# Altium schematic symbol library CUSTOM SCH - Copy.SchLib: 494 symbols (part 3 of 6) (continued)
## Micro HDMI Conn (continued)
HDMI - Micro Receptacle Connector 19 Position Surface Mount, Right Angle
footprint 46765-0001
footprint HDMI MICRO
pins: 1 HOT_PLUG_DETECT, 2 UTILITY, 3 TMDS_DATA2+, 4 TMDS_DATA2_SHIELD, 5 TMDS_DATA2-, 6 TMDS_DATA1+, 7 TMDS_DATA1_SHIELD, 8 TMDS_DATA1-, 9 TMDS_DATA0+, 10 TMDS_DATA0_SHIELD, 11 TMDS_DATA0-, 12 TMDS_CLOCK+, 13 TMDS_CLOCK_SHIELD, 14 TMDS_CLOCK-, 15 CEC, 16 DDC/CEC_GROUND, 17 SCL, 18 SDA, 19 +5V_POWER

## MICROPHONE
designator J?
MEMS Microphones High Dynamic Range Microphone with Differential Output and Low Power; Manufacturer Part Number: ICS-40619; Case/PackageManufacturer Part Number: LGA-6
footprint MIC-3.50 × 2.65 × 0.98 mm
pins: 1 GND, 2 GND, 3 OUTPUT-, 4 OUTPUT+, 5 GND, 6 VDD

## MK24-A-3
designator S?, comment Magnetic/Reed Switch
Molded Body Reed Switch SPST-NO 23 ~ 50AT Operate Range 1W 100mA _AC/DC_ 30V Surface Mount; Manufacturer Part Number: MK24-A-3; Package: SMD/SMT; Value: *
footprint MK24-A-3 (Reed Switch)
pins: 1, 2

## MMBT2222AM3T5G
designator Q?
ComponentLink1Description: Manufacturer Link; ComponentLink1URL: http://www.fairchildsemi.com/; ComponentLink2Description: Datasheet; ComponentLink2URL: http://www.fairchildsemi.com/ds/2N%2F2N3904.pdf
simulation model 2N3904 (NPN)
signal-integrity model 2N3904
pins: 1 B, 2 E, 3 C

## MMBT3904
designator Q?
SOT-23, 60V, 0.2A, NPN Bipolar Transistor; Package: SOT-23-3; Manufacturer Part Number: MMBT3904; Value: *
footprint SOT23_MMB3904
pins: 1 B, 2 E, 3 C

## MMBT3904_1
designator Q?
Bipolar _BJT_ Transistor NPN 40V 200mA 270MHz 350mW Surface Mount SOT-23-3; Manufacturer Part Number: MMBT3904; MF: STMicroelectronics; Price: None; Package: SOT-23-3 Taiwan Semiconductor; Value: *; Availability: Unavailable; SnapEDA_Link: https://www.snapeda.com/parts/MMBT3904/STMicroelectronics/view-part/2875870/?ref=snap
footprint SOT95P240X120-3N
pins: B 1, C 3, E 2

## MMBT3906
designator Q?
Bipolar (BJT) Transistor PNP 40V 200mA 250MHz 300mW Surface Mount SOT-23-3; Manufacturer Part Number: MMBT3906; Package: SOT-23-3
footprint SOT95P240X120-3N
footprint SOT95P240X120-3N
pins: 1 B, 2 E, 3 C

## MOSFET N_2SK3018
designator Q?  Manufacturer Part Number: 2SK3018  Case/Package: SOT-323
NMOS,2SK3018,SOT_323,Id=0.1A,Vds=30V
footprint SOT323
pins: 1 GATE, 2 SOURCE, 3 DRAIN

## MOSFET N_WNM6002-3/TR
designator Q?  Manufacturer Part Number: WNM6002-3/TR  Case/Package: SOT-323
NMOS,WNM6002-3/TR,SOT_323,Id=0.3A,Vds=60V
footprint SOT323
pins: 1 GATE, 2 SOURCE, 3 DRAIN

## MOSFET P_WPM3407
designator Q?  Manufacturer Part Number: WPM3407-3/TR  Case/Package: SOT-23
PMOS,WPM3407-3/TR,SOT_23,Id=4.4A,Vds=30V
footprint SOT23
footprint SOT_23
pins: 1 GATE, 2 SOURCE, 3 DRAIN

## MOSFET Si2302CDS
designator Q?, comment MOSFET-N Si2302CDS  (value not drawn)
N-Channel 20V 3A 1.25W (Ta) Surface Mount SOT-23; Manufacturer Part Number: SI2302-TP; ComponentLink1URL: http://www.vishay.com/docs/68645/si2302cd.pdf?src-supplier=Avnet; ComponentLink1Description: http://www.vishay.com/docs/68645/si2302cd.pdf?src-supplier=Avnet; ComponentLink2URL: http://www.farnell.com/datasheets/1719572.pdf?src-supplier=Element14; ComponentLink2Description: http://www.farnell.com/datasheets/1719572.pdf?src-supplier=Element14; ComponentLink3URL: http://www.vishay.com/docs/68645/si2302cd.pdf?src-supplier=Future+Electronics; ComponentLink3Description: http://www.vishay.com/docs/68645/si2302cd.pdf?src-supplier=Future+Electronics; ComponentLink4URL: http://www.vishay.com/docs/68645/si2302cds.pdf?src-supplier=Digi-Key; ComponentLink4Description: http://www.vishay.com/docs/68645/si2302cds.pdf?src-supplier=Digi-Key; Case/Package: SOT-23; ComponentLink5URL: http://www.mccsemi.com/up_pdf/SI2302(SOT-23).pdf?src-supplier=Digi-Key; ComponentLink5Description: http://www.mccsemi.com/up_pdf/SI2302(SOT-23).pdf?src-supplier=Digi-Key
simulation model NMOS (MOSFET-N)
footprint SOT95P240X115-3N
footprint SOT-23
pins: 1 G, 2 S, 3 D

## MOSFET_N_WNM2016
designator Q?  Manufacturer Part Number: WNM2016-3/TR  Case/Package: SOT-23
NMOS,WNM2016-3/TR,SOT_23,Id=3.2A,Vds=20V
footprint SOT23
footprint SOT_23
footprint SOT23-3
pins: 1 GATE, 2 SOURCE, 3 DRAIN

## MP1497
designator U?
footprint TSOT23-8
pins: 1 SS, 2 IN, 3 SW, 4 GND, 5 BST, 6 EN, 7 VCC, 8 FB

## MP2494DN
designator U?
Switching Voltage Regulators 2A; Manufacturer Part Number: MP2494DN-LF; Case/Package: SOIC8
footprint SOIC127P600X170-9N
footprint SOIC127P600X170-9N
pins: 1 VIN, 2 GND_1, 3 EN, 4 FB, 5 SS, 6 GS, 7 BST, 8 SW, 9 EPAD

## MP5416GR
designator U?
PMIC MP5416; Manufacturer Part Number: MP5416GR-0001-Z; Case/Package: QFN-28
footprint MP5416GR0001Z
pins: 1 VIN1, 2 SW1, 3 GND1, 4 GND3, 5 SW3, 6 VIN3, 7 FB3, 8 RSTO, 9 SCL, 10 SDA, 11 OUT4, 12 OUT5, 13 VIN5, 14 FB4, 15 VIN4, 16 SW4, 17 GND4, 18 GND2, 19 SW2, 20 VIN2, 21 FB2, 22 OUT3, 23 OUT2, 24 OUT_RTC, 25 AGND, 26 AVIN, 27 FB1, 28 NPBIN

## MP8007
designator U?
Power Over Ethernet Controller Channel 802.3af (PoE) 28-QFN (4x5); Manufacturer Part Number: MP8007; Case/Package: QFN-28 Monolithic Power Systems
footprint QFN28-4X5MM
pins: 1 AUX, 2 DET, 4 VDD, 5 FB2, 6 MODE, 7 FB1, 8 ILIM, 9 AGND, 10 VCC, 12 SW, 13 SW, 16 GND, 17 GND, 18 PG, 20 RTN, 21 RTN, 23 VSS, 24 VSS, 25 FTY, 26 CLASS, 27 T2P, 29 GND

## MP8759GD-Z
designator U?  Manufacturer Part Number: MP8759GD-Z
Case/Package: QFN-12
footprint QFN-12_2x3mm
pins: 1 VIN, 2 PGND, 3 PG, 4 NC, 5 VOUT, 6 MODE, 7 SW, 8 BST, 9 VCC, 10 AGND, 11 FB, 12 EN

## MPU-6050
designator U?
Accelerometer, Gyroscope, 6 Axis Sensor IÂ²C Output; MF: TDK InvenSense; Package: VFQFN-24 TDK InvenSense; Manufacturer Part Number: MPU-6050; Value: *
footprint QFN50P400X400X95-24N
footprint QFN50P400X400X95-24N
pins: 1 CLKIN (in), 6 AUX_DA (io), 7 AUX_CL (in), 8 VLOGIC (power), 9 AD0 (in), 10 REGOUT, 11 FSYNC (in), 12 INT (out), 13 VDD (power), 18 GND (power), 19 RESV@1, 20 CPOUT, 21 RESV@2, 22 RESV, 23 SCL (in), 24 SDA (io)

## MX25L512EOI-10G
designator U?
Manufacturer Part Number: MX25L512EOI-10G; Case/Package: TSSOP-8
footprint TSSOP-8
pins: 1 CS#, 2 SO/SIO1, 3 WP#, 4 GND, 5 SI/SIO0, 6 SCLK, 7 HOLD#, 8 VCC

## MX25L12835F
designator U?
Macronix MX25L12835FM2I-10G 128Mbit Flash Memory; 3V; Manufacturer Part Number: MX25L12835FM2I-10G; Case/Package: SOP-8
footprint SOIC127P790X216-8N
pins: 1 CS#, 2 SO/SIO1, 3 WP#/SIO2, 4 GND, 5 SI/SIO0, 6 SCLK, 7 RESET#/SIO3, 8 VCC

## NAND GATE 2 INPUT
designator U?
Manufacturer: ON Semiconductor / Fairchild; Manufacturer Part Number: NC7S00M5X; Max Supply Voltage: 6V; Min Supply Voltage: 2V; High Level Output Current: -2.6mA; Low Level Output Current: 2.6mA; Propagation Delay: 12.2ns; Number of Gates: 1; Logic Function: NAND; Quiescent Current: 1uA; Number of Inputs: 2; Turn-On Delay Time: 100ns; Supplier 1: Mouser; Stock 1: 16117; Pricing 1: 1=0.49, 10=0.318, 50=0.318, 100=0.136, 1000=0.104, 3000=0.079, 9000=0.07, 10000=0.07, 24000=0.066, 45000=0.064 (USD); Mount: Surface Mount; Case/Package: SOT-23-5; Number of Pins: 5; Weight: 0.03g; Min Operating Temperature: -40°C; Max Operating Temperature: 85°C; Packaging: Tape and Reel; Number of Elements: 1; Number of Outputs: 1; Package Quantity: 1; Number of Circuits: 1; Output Current: 2.6mA; Radiation Hardening: No; REACH SVHC: No SVHC; Lead Free: Lead Free; ComponentLink1URL: https://www.onsemi.com/pub/Collateral/NC7S00-D.PDF?src-supplier=Digi-Key; ComponentLink1Description: https://www.onsemi.com/pub/Collateral/NC7S00-D.PDF?src-supplier=Digi-Key; ComponentLink2URL: https://www.fairchildsemi.com/datasheets/NC/NC7S00.pdf?src-supplier=Avnet; ComponentLink2Description: https://www.fairchildsemi.com/datasheets/NC/NC7S00.pdf?src-supplier=Avnet; ComponentLink3URL: http://www.fairchildsemi.com/ds/NC/NC7S00.pdf?src-supplier=Future+Electronics; ComponentLink3Description: http://www.fairchildsemi.com/ds/NC/NC7S00.pdf?src-supplier=Future+Electronics; ComponentLink4URL: http://www.farnell.com/datasheets/88771.pdf?src-supplier=Element14; ComponentLink4Description: http://www.farnell.com/datasheets/88771.pdf?src-supplier=Element14; ComponentLink5URL: http://www.fairchildsemi.com/ds/NC/NC7S00.pdf?src-supplier=Avnet+Europe; ComponentLink5Description: http://www.fairchildsemi.com/ds/NC/NC7S00.pdf?src-supplier=Avnet+Europe; ComponentLink6URL: https://www.verical.com/server-webapp/html/getDatasheet?partID=72609&src-supplier=Verical; ComponentLink6Description: https://www.verical.com/server-webapp/html/getDatasheet?partID=72609&src-supplier=Verical; ComponentLink7URL: http://www.fairchildsemi.com/datasheets/NC/NC7S00.pdf?src-supplier=Digi-Key; ComponentLink7Description: http://www.fairchildsemi.com/datasheets/NC/NC7S00.pdf?src-supplier=Digi-Key; Supplier Part Number 1: 512-NC7S00M5X
footprint SOT23-5
pins: 1 A, 2 B, 3 GND, 4 Y, 5 VCC

## Nano sim card
designator J?
Manufacturer: Wurth Electronics; Manufacturer Part Number: 693043020611; Number of Positions: 6; Connector Type: Connector; Supplier 1: Mouser; Stock 1: 7555; Pricing 1: 1=1.69, 10=1.66, 25=1.66, 50=1.54, 100=1.41, 250=1.41, 500=1.23, 1000=1.11 (USD); Mount: Surface Mount; Number of Pins: 6; Contact Material: Copper Alloy; Contact Plating: Gold; Packaging: Tape and Reel; Number of Contacts: 6; Features: Shielded; REACH SVHC: Unknown; Lead Free: Lead Free; ComponentLink1URL: https://www.distrelec.biz/Web/Downloads/40/13/693043020611.pdf?mime=application%2Fpdf&src-supplier=Distrelec; ComponentLink1Description: https://www.distrelec.biz/Web/Downloads/40/13/693043020611.pdf?mime=application%2Fpdf&src-supplier=Distrelec; ComponentLink2URL: https://katalog.we-online.de/em/datasheet/693043020611.pdf?src-supplier=Digi-Key; ComponentLink2Description: https://katalog.we-online.de/em/datasheet/693043020611.pdf?src-supplier=Digi-Key; ComponentLink3URL: http://www.farnell.com/cad/1889811.pdf?src-supplier=Element14; ComponentLink3Description: http://www.farnell.com/cad/1889811.pdf?src-supplier=Element14; Supplier Part Number 1: 710-693043020611
footprint Nano sim card connector
pins: 7 S1, 8 S2, 9 S3, 10 S4, 11 S5, 12 S6, C1 VDD, C2 RST, C3 CLK, C5 GND, C6 VPP, C7 I/O

## Nano sim card_1
designator J?
Standard Size Sim Holder MUP-C720 (Push-Push Lock Type); Manufacturer: MUP Industrial Co.; Manufacturer Part Number: MUP-C720; ComponentLink1URL: https://www.distrelec.biz/Web/Downloads/40/13/693043020611.pdf?mime=application%2Fpdf&src-supplier=Distrelec; ComponentLink1Description: https://www.distrelec.biz/Web/Downloads/40/13/693043020611.pdf?mime=application%2Fpdf&src-supplier=Distrelec; ComponentLink2URL: https://katalog.we-online.de/em/datasheet/693043020611.pdf?src-supplier=Digi-Key; ComponentLink2Description: https://katalog.we-online.de/em/datasheet/693043020611.pdf?src-supplier=Digi-Key; ComponentLink3URL: http://www.farnell.com/cad/1889811.pdf?src-supplier=Element14; ComponentLink3Description: http://www.farnell.com/cad/1889811.pdf?src-supplier=Element14
footprint MUP-C720
pins: 7 CD2, 8 CD1, 9 S3, 10 S4, C1 VDD, C2 RST, C3 CLK, C5 GND, C6 VPP, C7 I/O

## NCV8114ASN180T1G
designator U?
LDO Regulator 1.8V; Manufacturer_Name: ON Semiconductor; Manufacturer Part Number: NCV8114ASN180T1G; Datasheet Link: http://www.onsemi.com/pub/Collateral/NCV8114-D.PDF; Height: 1.1mm; Mouser Part Number: 863-NCV8114ASN180T1G
footprint SOT95P275X110-5N
footprint SOT95P275X110-5N
pins: 1 IN, 2 GND, 3 EN, 4 N/C, 5 OUT

## Net Tie
designator NT?, comment NetTie  (net tie, no BOM)
footprint Net_Tie
pins: 1, 2
text: NT

## Net Tie_1
designator NT?, comment NetTie  (net tie, no BOM)
footprint coil_50mm
pins: 1, 2

## NPN_BC547
designator Q2
Manufacturer: ON Semiconductor / Fairchild; Mfr No.: MMBT3904; Value: NPN; Collector Emitter Breakdown Voltage: 40V; Power Dissipation: 350mW; Max Collector Current: 200mA; Collector Base Voltage (VCBO): 60V; Emitter Base Voltage (VEBO): 6V; Frequency: 300MHz; hFE Min: 100; Number of Elements: 1; Element Configuration: Single; Collector Emitter Saturation Voltage: 300mV; Supplier 1: RSComponents; Supplier Part Number 1: 739-0303; Stock 1: 0; Mount: Surface Mount; Package: SOT-23; Number of Pins: 3; Weight: 0.03g; Contact Plating: Matte,Tin; Min Operating Temperature: -55°C; Max Operating Temperature: 150°C; Packaging: Tape and Reel; Collector Emitter Voltage (VCEO): 40V; Voltage Rating (DC): 40V; Package Quantity: 1; Max Power Dissipation: 350mW; Transition Frequency: 300MHz; Max Breakdown Voltage: 40V; Gain Bandwidth Product: 300MHz; Current Rating: 200mA; Max Frequency: 300MHz; Termination: SMD/SMT; Length: 0.25inch; Height: 0.25inch; Width: 0.25inch; Radiation Hardening: No; REACH SVHC: No SVHC; Lead Free: Lead Free; ComponentLink1URL: https://www.onsemi.com/pub/Collateral/PZT3904-D.pdf?src-supplier=Digi-Key; ComponentLink1Description: https://www.onsemi.com/pub/Collateral/PZT3904-D.pdf?src-supplier=Digi-Key; ComponentLink2URL: https://www.fairchildsemi.com/package-drawings/MA/MA03B.pdf?src-supplier=Digi-Key; ComponentLink2Description: https://www.fairchildsemi.com/package-drawings/MA/MA03B.pdf?src-supplier=Digi-Key; ComponentLink3URL: http://www.farnell.com/datasheets/2150085.pdf?src-supplier=Element14; ComponentLink3Description: http://www.farnell.com/datasheets/2150085.pdf?src-supplier=Element14; ComponentLink4URL: http://www.fairchildsemi.com/ds/MM/MMBT3904.pdf?src-supplier=Avnet+Europe; ComponentLink4Description: http://www.fairchildsemi.com/ds/MM/MMBT3904.pdf?src-supplier=Avnet+Europe; ComponentLink5URL: https://www.verical.com/server-webapp/html/getDatasheet?partID=110107&src-supplier=Verical; ComponentLink5Description: https://www.verical.com/server-webapp/html/getDatasheet?partID=110107&src-supplier=Verical; ComponentLink6URL: http://www.fairchildsemi.com/ds/2N/2N3904.pdf?src-supplier=Element14; ComponentLink6Description: http://www.fairchildsemi.com/ds/2N/2N3904.pdf?src-supplier=Element14; ComponentLink7URL: https://www.fairchildsemi.com/datasheets/MM/MMBT3904.pdf?src-supplier=Avnet; ComponentLink7Description: https://www.fairchildsemi.com/datasheets/MM/MMBT3904.pdf?src-supplier=Avnet; ComponentLink8URL: http://www.fairchildsemi.com/ds/MM/MMBT3904.pdf?src-supplier=Future+Electronics; ComponentLink8Description: http://www.fairchildsemi.com/ds/MM/MMBT3904.pdf?src-supplier=Future+Electronics
footprint SOT23 (PNP Transistor Pack)
pins: B, C, E

## NPN_S8050
designator Q?  Manufacturer Part Number: S8050  Case/Package: SOT-23
NPN S8050 SOT23
footprint SOT23 (SOT-23; 3 Leads; Body 3.0 x 2.6 mm Pitch 0.95mm)
pins: 1 BASE, 2 EMITTER, 3 COLLECTOR

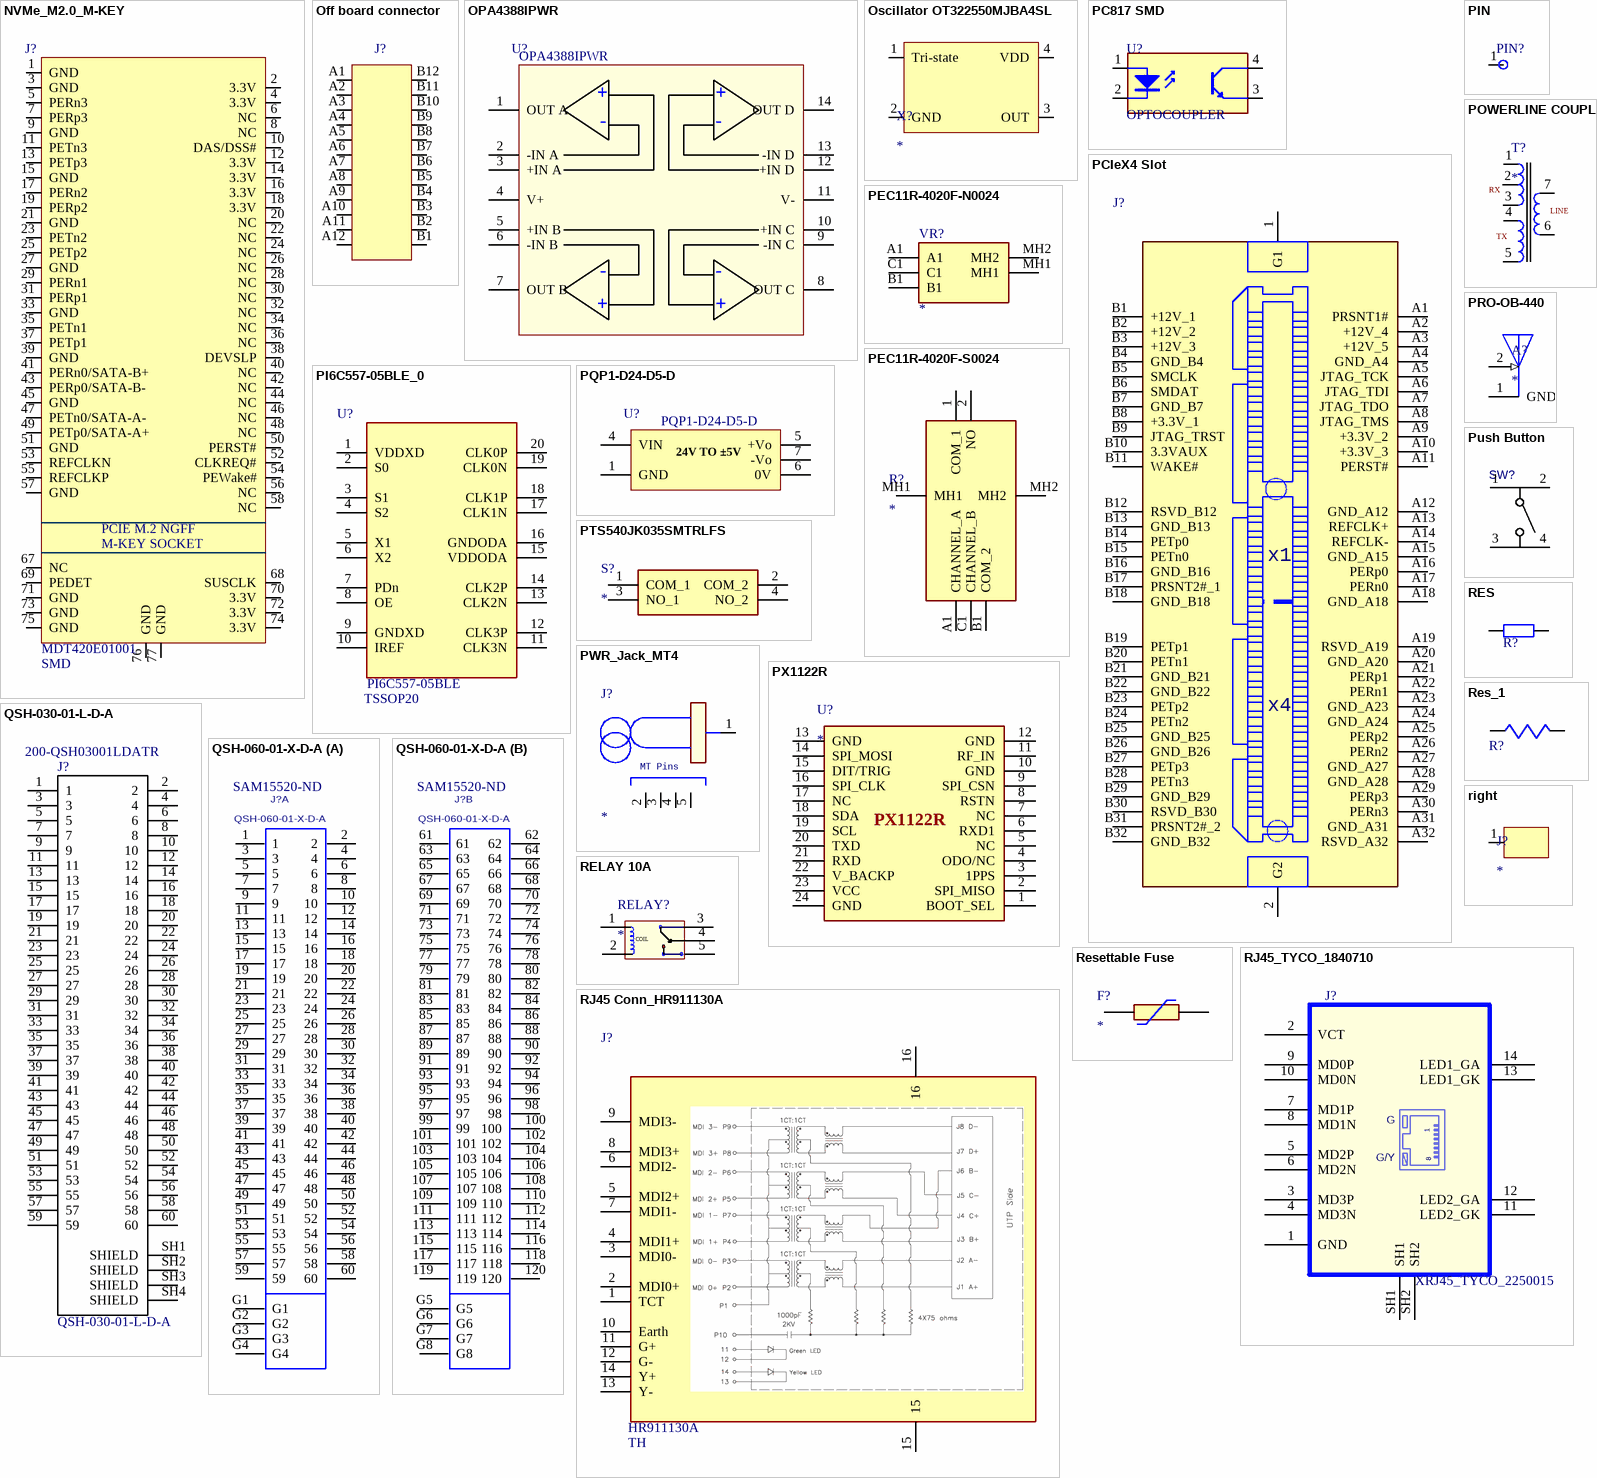
[diagram p20: symbols NVMe_M2.0_M-KEY to RJ45_TYCO_1840710]

## NVMe_M2.0_M-KEY
designator J?  Case/Package: SMD  Manufacturer Part Number: MDT420E01001
M.2 0.5mm Surface Mount 67 SMD Card Edge Connectors ROHS
footprint NVME_M 2.0
pins: 1 GND, 2 3.3V, 3 GND, 4 3.3V, 5 PERn3, 6 NC, 7 PERp3, 8 NC, 9 GND, 10 DAS/DSS#, 11 PETn3, 12 3.3V, 13 PETp3, 14 3.3V, 15 GND, 16 3.3V, 17 PERn2, 18 3.3V, 19 PERp2, 20 NC, 21 GND, 22 NC, 23 PETn2, 24 NC, 25 PETp2, 26 NC, 27 GND, 28 NC, 29 PERn1, 30 NC, 31 PERp1, 32 NC, 33 GND, 34 NC, 35 PETn1, 36 NC, 37 PETp1, 38 DEVSLP, 39 GND, 40 NC, 41 PERn0/SATA-B+, 42 NC, 43 PERp0/SATA-B-, 44 NC, 45 GND, 46 NC, 47 PETn0/SATA-A-, 48 NC, 49 PETp0/SATA-A+, 50 PERST#, 51 GND, 52 CLKREQ#, 53 REFCLKN, 54 PEWake#, 55 REFCLKP, 56 NC, 57 GND, 58 NC, 67 NC, 68 SUSCLK, 69 PEDET, 70 3.3V, 71 GND, 72 3.3V, 73 GND, 74 3.3V, 75 GND, 76 GND, 77 GND
text: PCIE M.2 NGFF; M-KEY SOCKET

## Off board connector
designator J?
USB 3.1 Waterproof C Female Connector
pins: A1, A2, A3, A4, A5, A6, A7, A8, A9, A10, A11, A12, B1, B2, B3, B4, B5, B6, B7, B8, B9, B10, B11, B12

## OPA4388IPWR
designator U?  Manufacturer Part Number: OPA4388IPWR
Op Amp Quad Zero Drift Amplifier R-R I/O ±2.75V/5.5V 14-Pin TSSOP; Manufacturer: Texas Instruments; Supplier 1: Digi-Key; RoHS: No; Case/Package: TSSOP-14; Stock 1: 1444; Pricing 1: 1=4.64000, 10=4.16700, 25=3.93960, 100=3.23940, 250=2.90668, 500=2.80160, 1000=2.32883 (USD); Supplier Part Number 1: 296-OPA4388IPWRCT-ND
footprint TSSOP-14
pins: 1 OUT A, 2 -IN A, 3 +IN A , 4 V+, 5 +IN B , 6 -IN B, 7 OUT B, 8  OUT C, 9 -IN C, 10 +IN C, 11 V-, 12 +IN D, 13 -IN D, 14 OUT D
text: +; -

## Oscillator OT322550MJBA4SL
designator X?
1.8V~3.3V -40℃~+85℃ ±10ppm 50MHz SMD3225-4P Oscillators ROHS (OT322550MJBA4SL) (C717684); Vicharak-PN: V000176; Manufacturer Part Number: OT322550MJBA4SL; Case/Package: SMD3225; Frequency: 50mhz
footprint Crystal_3225 (3225 pack)
pins: 1 Tri-state, 2 GND, 3 OUT, 4 VDD

## PC817 SMD
designator U?, comment OPTOCOUPLER
Transistor Output Optocouplers Hi-Iso Photo 1-Ch; Manufacturer Part Number: PC817 SMD; Case/Package: SMD
footprint DIP-4 (DIP; 4 Leads; Row Spacing 7.62 mm; Pitch 2.54 mm)
footprint pc817_smd
pins: 1 A "Anode", 2 K "Cathode", 3 E "Emitter", 4 C "Collector"

## PCIeX4 Slot
designator J?
PCIe-SMT-64PIN; Manufacturer Part Number: *; Case/Package: *
footprint PCIE64_X4_SMT
pins: 1 G1, 2 G2, A1 PRSNT1#, A2 +12V_4, A3 +12V_5, A4 GND_A4, A5 JTAG_TCK, A6 JTAG_TDI, A7 JTAG_TDO, A8 JTAG_TMS, A9 +3.3V_2, A10 +3.3V_3, A11 PERST#, A12 GND_A12, A13 REFCLK+, A14 REFCLK-, A15 GND_A15, A16 PERp0, A17 PERn0, A18 GND_A18, A19 RSVD_A19, A20 GND_A20, A21 PERp1, A22 PERn1, A23 GND_A23, A24 GND_A24, A25 PERp2, A26 PERn2, A27 GND_A27, A28 GND_A28, A29 PERp3, A30 PERn3, A31 GND_A31, A32 RSVD_A32, B1 +12V_1, B2 +12V_2, B3 +12V_3, B4 GND_B4, B5 SMCLK, B6 SMDAT, B7 GND_B7, B8 +3.3V_1, B9 JTAG_TRST, B10 3.3VAUX, B11 WAKE#, B12 RSVD_B12, B13 GND_B13, B14 PETp0, B15 PETn0, B16 GND_B16, B17 PRSNT2#_1, B18 GND_B18, B19 PETp1, B20 PETn1, B21 GND_B21, B22 GND_B22, B23 PETp2, B24 PETn2, B25 GND_B25, B26 GND_B26, B27 PETp3, B28 PETn3, B29 GND_B29, B30 RSVD_B30, B31 PRSNT2#_2, B32 GND_B32
text: x1; x4

## PEC11R-4020F-N0024
designator VR?
Rotary Encoder RS Components PEC11R-4020F-N0024; Datasheet Link: https://www.bourns.com/docs/Product-Datasheets/PEC11R.pdf; Manufacturer Part Number: PEC11R-4020F-N0024; Mouser Part Number: 652-PEC11R-4020F-N24
footprint PEC11R4215FN0012
pins: A1, B1, C1, MH1, MH2

## PEC11R-4020F-S0024
designator R?
Rotary Encoder with switch; Manufacturer Part Number: PEC11R-4020F-S0024; Datasheet Link: https://www.bourns.com/docs/Product-Datasheets/PEC11R.pdf; Height: 27.5mm; Mouser Part Number: 652-PEC11R-4020F-S24
footprint PEC11R4220FS0024
pins: 1 COM_1, 2 NO, A1 CHANNEL_A, B1 COM_2, C1 CHANNEL_B, MH1, MH2

## PI6C557-05BLE_0
designator U?  Case/Package: TSSOP20
PI6C557-05BLE; Manufacturer Part Number: PI6C557-05BLE
footprint TSSOP20
footprint TSSOP20_6R50x4R40x1R20
footprint TSSOP20 (TSSOP20_6R50X4R40X1R20)
pins: 1 VDDXD, 2 S0, 3 S1, 4 S2, 5 X1, 6 X2, 7 PDn, 8 OE, 9 GNDXD, 10 IREF, 11 CLK3N, 12 CLK3P, 13 CLK2N, 14 CLK2P, 15 VDDODA, 16 GNDODA, 17 CLK1N, 18 CLK1P, 19 CLK0N, 20 CLK0P

## PIN
designator PIN?  (value not drawn)  (no BOM)
footprint pin
pins: 1 VOUT

## POWERLINE COUPLER
designator T?
pins: 1, 2, 3, 4, 5, 6, 7
text: RX; LINE; TX

## PQP1-D24-D5-D
designator U?  Manufacturer Part Number: PQP1-D24-D5-D
Manufacturer: CUI; Supplier 1: Digi-Key; RoHS: No; Stock 1: 67; Case/Package: TH; Supplier Part Number 1: 102-PQP1-D24-D5-D-ND
pins: 1 GND, 4 VIN, 5 +Vo, 6 0V, 7 -Vo
text: 24V TO ±5V

## PRO-OB-440
designator A?
RF ANT 2.4GHZ STAMPED MET SLD; Manufacturer: Proant; Manufacturer Part Number: PRO-OB-440; Number of Bands: 1; Return Loss: -10dB; Supplier 1: Digi-Key; RoHS: No; Category: RF Antennas; Stock 1: 48124; Pricing 1: 1=0.74000, 10=0.64700, 25=0.60800, 100=0.49640, 250=0.46104, 500=0.39238 (USD); Mount: Surface Mount; Packaging: Cut Tape; Termination: Solder; ComponentLink1URL: https://media.digikey.com/pdf/Data%20Sheets/Proant%20PDF's/PRO-OB-440_Dwg.PDF?src-supplier=Digi-Key; ComponentLink1Description: https://media.digikey.com/pdf/Data%20Sheets/Proant%20PDF's/PRO-OB-440_Dwg.PDF?src-supplier=Digi-Key; ComponentLink2URL: http://www.proant.se/files/user/Application%20note%20-%20OnBoard%20SMD%20GNSS%20rev%202.0.pdf?src-supplier=Digi-Key; ComponentLink2Description: http://www.proant.se/files/user/Application%20note%20-%20OnBoard%20SMD%20GNSS%20rev%202.0.pdf?src-supplier=Digi-Key; ComponentLink3URL: http://www.proant.se/files/user/Documents/Datasheet%20-%20OnBoard%20SMD%202400%20MHz%20rev%203.pdf?src-supplier=Digi-Key; ComponentLink3Description: http://www.proant.se/files/user/Documents/Datasheet%20-%20OnBoard%20SMD%202400%20MHz%20rev%203.pdf?src-supplier=Digi-Key; Supplier Part Number 1: 1532-1001-1-ND
footprint ANT_PRO-OB-440
pins: 1 GND (power), 2 FEED (in)

## PTS540JK035SMTRLFS
designator S?
PTS540JK035SMTRLFS (Tactile Switches) Momentery Switch; Manufacturer Part Number: PTS540JK035SMTRLFS; Case/Package: SMD
footprint PTS540JK035SMTRLFS
pins: 1 COM_1, 2 COM_2, 3 NO_1, 4 NO_2

## Push Button
designator SW?
Push Button SPST 50mA 3X1.7 MM 100mΩ Tactile Switch; Manufacturer Part Number: TS-1809SM-C; Case/Package: SMD
footprint Push button (TS-1089S-02526)
pins: 1, 2, 3, 4

## PWR_Jack_MT4
designator J?
pins: 1 (io), 2 (io), 3 (io), 4, 5
text: MT Pins

## PX1122R
designator U?
SkyTra PX1122R Multi band GNSS Receiver with RTK; Manufacturer Part Number: PX1122R; Case/Package: SMD
footprint PX1122R
pins: 1 BOOT_SEL, 2 SPI_MISO, 3 1PPS, 4 ODO/NC, 5 NC, 6 RXD1, 7 NC, 8 RSTN, 9 SPI_CSN, 10 GND, 11 RF_IN, 12 GND, 13 GND, 14 SPI_MOSI, 15 DIT/TRIG, 16 SPI_CLK, 17 NC, 18 SDA, 19 SCL, 20 TXD, 21 RXD, 22 V_BACKP, 23 VCC, 24 GND

## QSH-030-01-L-D-A
designator J?  Supplier Part Number 1: 200-QSH03001LDATR
Conn Micro High Speed Socket Strip SKT 60 POS 0.5mm Solder ST SMD T/R; Manufacturer: Samtec; Manufacturer Part Number: QSH-030-01-L-D-A-TR; Max Voltage Rating (AC): 125V; Number of Contacts: 60; Gender: Female; Supplier 1: Mouser; Stock 1: 471; Pricing 1: 1=9.52, 10=8.81, 50=7.9, 100=7.38, 1000=6.19, 10000=5.95 (USD); Contact Plating: Gold; Contact Material: Bronze; Housing Color: Black; Housing Material: Polymer; Min Operating Temperature: -55°C; Max Operating Temperature: 125°C; Number of Rows: 2; Packaging: Tape and Reel; Termination: Solder; Orientation: Straight; Voltage Rating (AC): 125V; Length: 21.27mm; Pitch: 0.5mm; Depth: 7.49mm; Radiation Hardening: No; Lead Free: Lead Free; ComponentLink1URL: http://www.samtec.com/ftppub/pdf/QSH.PDF?src-supplier=Avnet+Europe; ComponentLink1Description: http://www.samtec.com/ftppub/pdf/QSH.PDF?src-supplier=Avnet+Europe; ComponentLink2URL: https://www.samtec.com/ftppub/pdf/QSH.PDF?src-supplier=Avnet; ComponentLink2Description: https://www.samtec.com/ftppub/pdf/QSH.PDF?src-supplier=Avnet
footprint QSH-030-01-L-D-A
pins: 1, 2, 3, 4, 5, 6, 7, 8, 9, 10, 11, 12, 13, 14, 15, 16, 17, 18, 19, 20, 21, 22, 23, 24, 25, 26, 27, 28, 29, 30, 31, 32, 33, 34, 35, 36, 37, 38, 39, 40, 41, 42, 43, 44, 45, 46, 47, 48, 49, 50, 51, 52, 53, 54, 55, 56, 57, 58, 59, 60, SH1 SHIELD, SH2 SHIELD, SH3 SHIELD, SH4 SHIELD

## QSH-060-01-X-D-A
designator J?  Supplier Part Number 1: SAM15520-ND
HIGH SPEED SOCKET STRIP, .5mm PITCH, 60 PINS PER ROW; MANUFACTURER: SAMTEC; Manufacturer Part Number: QSH-060-01-H-D-A; Number of Contacts: 120; Max Voltage Rating (AC): 125V; Gender: Female; Pitch: 0.5mm; CREATED: March 10, 2015 - Wendy Xin; PCB DECAL: QSH-060-01-X-D-A; Supplier 1: Digi-Key; Stock 1: 12; Pricing 1: 1=13.19, 10=12.746, 25=12.306, 50=11.8666, 100=11.427, 250=11.2072, 500=10.9875 (USD); Contact Plating: Gold; Contact Material: Bronze; Housing Color: Black; Housing Material: Polymer; Min Operating Temperature: -55°C; Max Operating Temperature: 125°C; Number of Rows: 2; Packaging: Tray; Termination: Solder; Orientation: Straight; Length: 41.27mm; Depth: 7.49mm; Radiation Hardening: No; ComponentLink1URL: http://datasheet.octopart.com/QSH-060-01-H-D-A-Samtec-datasheet-97183482.pdf?src-supplier=Samtec; ComponentLink1Description: http://datasheet.octopart.com/QSH-060-01-H-D-A-Samtec-datasheet-97183482.pdf?src-supplier=Samtec; ComponentLink2URL: http://sigma.octopart.com/97183504/technical_drawing/Samtec-QSH-060-01-H-D-A.pdf?src-supplier=Samtec; ComponentLink2Description: http://sigma.octopart.com/97183504/technical_drawing/Samtec-QSH-060-01-H-D-A.pdf?src-supplier=Samtec
footprint QSH-060-01-X-D-A
part A pins: 1, 2, 3, 4, 5, 6, 7, 8, 9, 10, 11, 12, 13, 14, 15, 16, 17, 18, 19, 20, 21, 22, 23, 24, 25, 26, 27, 28, 29, 30, 31, 32, 33, 34, 35, 36, 37, 38, 39, 40, 41, 42, 43, 44, 45, 46, 47, 48, 49, 50, 51, 52, 53, 54, 55, 56, 57, 58, 59, 60, G1, G2, G3, G4
part B pins: 61, 62, 63, 64, 65, 66, 67, 68, 69, 70, 71, 72, 73, 74, 75, 76, 77, 78, 79, 80, 81, 82, 83, 84, 85, 86, 87, 88, 89, 90, 91, 92, 93, 94, 95, 96, 97, 98, 99, 100, 101, 102, 103, 104, 105, 106, 107, 108, 109, 110, 111, 112, 113, 114, 115, 116, 117, 118, 119, 120, G5, G6, G7, G8

## RELAY 10A
designator RELAY?
footprint RELAY 10A
pins: 1, 2, 3, 4, 5
text: COIL

## RES
designator R?
Thick Film Resistor -  ohm, 1%, 0402; Manufacturer Part Number: *; Value: *; Case/Package: *; Tolerance: *
pins: 1, 2

## Res_1
designator R?
-
pins: 1, 2

## Resettable Fuse
designator F?
Resettable Fuses - PPTC 12V     6A-HD    50A MAX 2920; Manufacturer Part Number: 2920L600/12MR; Value: 6A Hold; Case/Package: 2920
footprint Fuse 2920
pins: 1, 2

## right
designator J?
footprint right
footprint right
pins: 1

## RJ45 Conn_HR911130A
designator J?  Case/Package: TH  Manufacturer Part Number: HR911130A
RJ45 Connector
footprint HR911130A
pins: 1 TCT, 2 MDI0+, 3 MDI0-, 4 MDI1+, 5 MDI2+, 6 MDI2-, 7 MDI1-, 8 MDI3+, 9 MDI3-, 10 Earth, 11 G+, 12 G-, 13 Y-, 14 Y+, 15, 16

## RJ45_TYCO_1840710
designator J?, comment XRJ45_TYCO_2250015
Part_Number: 41500498; BOM_Level: 1; PCB Footprint: RJ45_TYCO_2250015-2; Revision: A
footprint RJ45_TYCO_2250015-2
pins: 1 GND, 2 VCT, 3 MD3P, 4 MD3N, 5 MD2P, 6 MD2N, 7 MD1P, 8 MD1N, 9 MD0P, 10 MD0N, 11 LED2_GK, 12 LED2_GA, 13 LED1_GK, 14 LED1_GA, SH1, SH2
text: G; G/Y

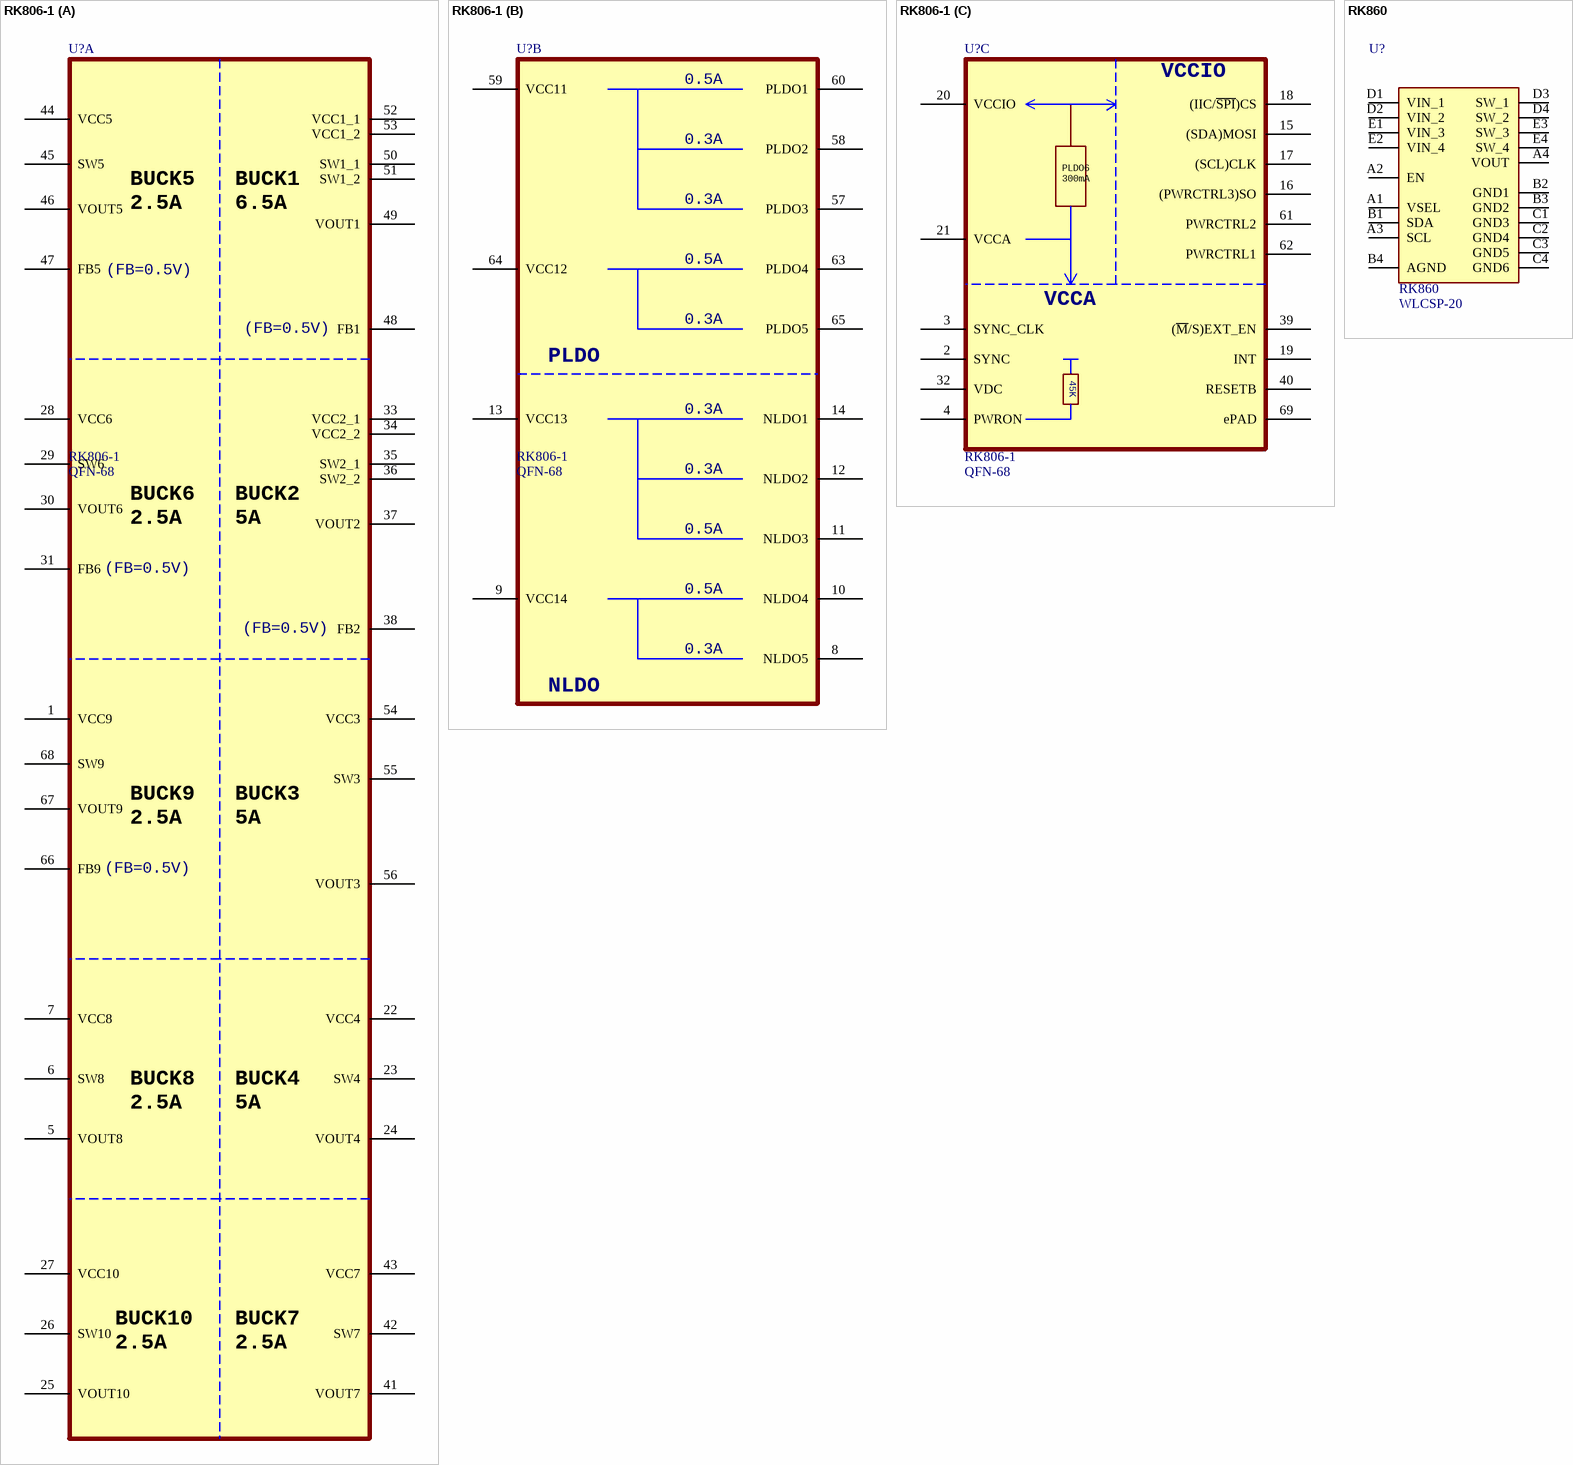
[diagram p21: symbols RK806-1 to RK860]

## RK806-1
designator U?  Manufacturer Part Number: RK806-1  Case/Package: QFN-68
PMIC, 7mmx7mm QFN68
footprint QFN68_7R00X7R00X0R80_T
part A pins: 1 VCC9, 5 VOUT8, 6 SW8, 7 VCC8, 22 VCC4, 23 SW4, 24 VOUT4, 25 VOUT10, 26 SW10, 27 VCC10, 28 VCC6, 29 SW6, 30 VOUT6, 31 FB6, 33 VCC2_1, 34 VCC2_2, 35 SW2_1, 36 SW2_2, 37 VOUT2, 38 FB2, 41 VOUT7, 42 SW7, 43 VCC7, 44 VCC5, 45 SW5, 46 VOUT5, 47 FB5, 48 FB1, 49 VOUT1, 50 SW1_1, 51 SW1_2, 52 VCC1_1, 53 VCC1_2, 54 VCC3, 55 SW3, 56 VOUT3, 66 FB9, 67 VOUT9, 68 SW9
part B pins: 8 NLDO5, 9 VCC14, 10 NLDO4, 11 NLDO3, 12 NLDO2, 13 VCC13, 14 NLDO1, 57 PLDO3, 58 PLDO2, 59 VCC11, 60 PLDO1, 63 PLDO4, 64 VCC12, 65 PLDO5
part C pins: 2 SYNC, 3 SYNC_CLK, 4 PWRON, 15 (SDA)MOSI, 16 (PWRCTRL3)SO, 17 (SCL)CLK, 18 (IIC/~{SPI})CS, 19 INT, 20 VCCIO, 21 VCCA, 32 VDC, 39 (~{M}/S)EXT_EN, 40 RESETB, 61 PWRCTRL2, 62 PWRCTRL1, 69 ePAD
part A text: BUCK5 / 2.5A; BUCK1 / 6.5A; (FB=0.5V); BUCK6 / 2.5A; BUCK2 / 5A; BUCK9 / 2.5A; BUCK3 / 5A; BUCK8 / 2.5A; BUCK4 / 5A; BUCK10 / 2.5A; BUCK7 / 2.5A
part B text: 0.5A; 0.3A; PLDO; NLDO
part C text: PLDO6 / 300mA; 45K

## RK860
designator U?  Manufacturer Part Number: RK860  Case/Package: WLCSP-20
footprint WLCSP20_1R65X2R05X0R63
pins: A1 VSEL, A2 EN, A3 SCL, A4 VOUT, B1 SDA, B2 GND1, B3 GND2, B4 AGND, C1 GND3, C2 GND4, C3 GND5, C4 GND6, D1 VIN_1, D2 VIN_2, D3 SW_1, D4 SW_2, E1 VIN_3, E2 VIN_4, E3 SW_3, E4 SW_4

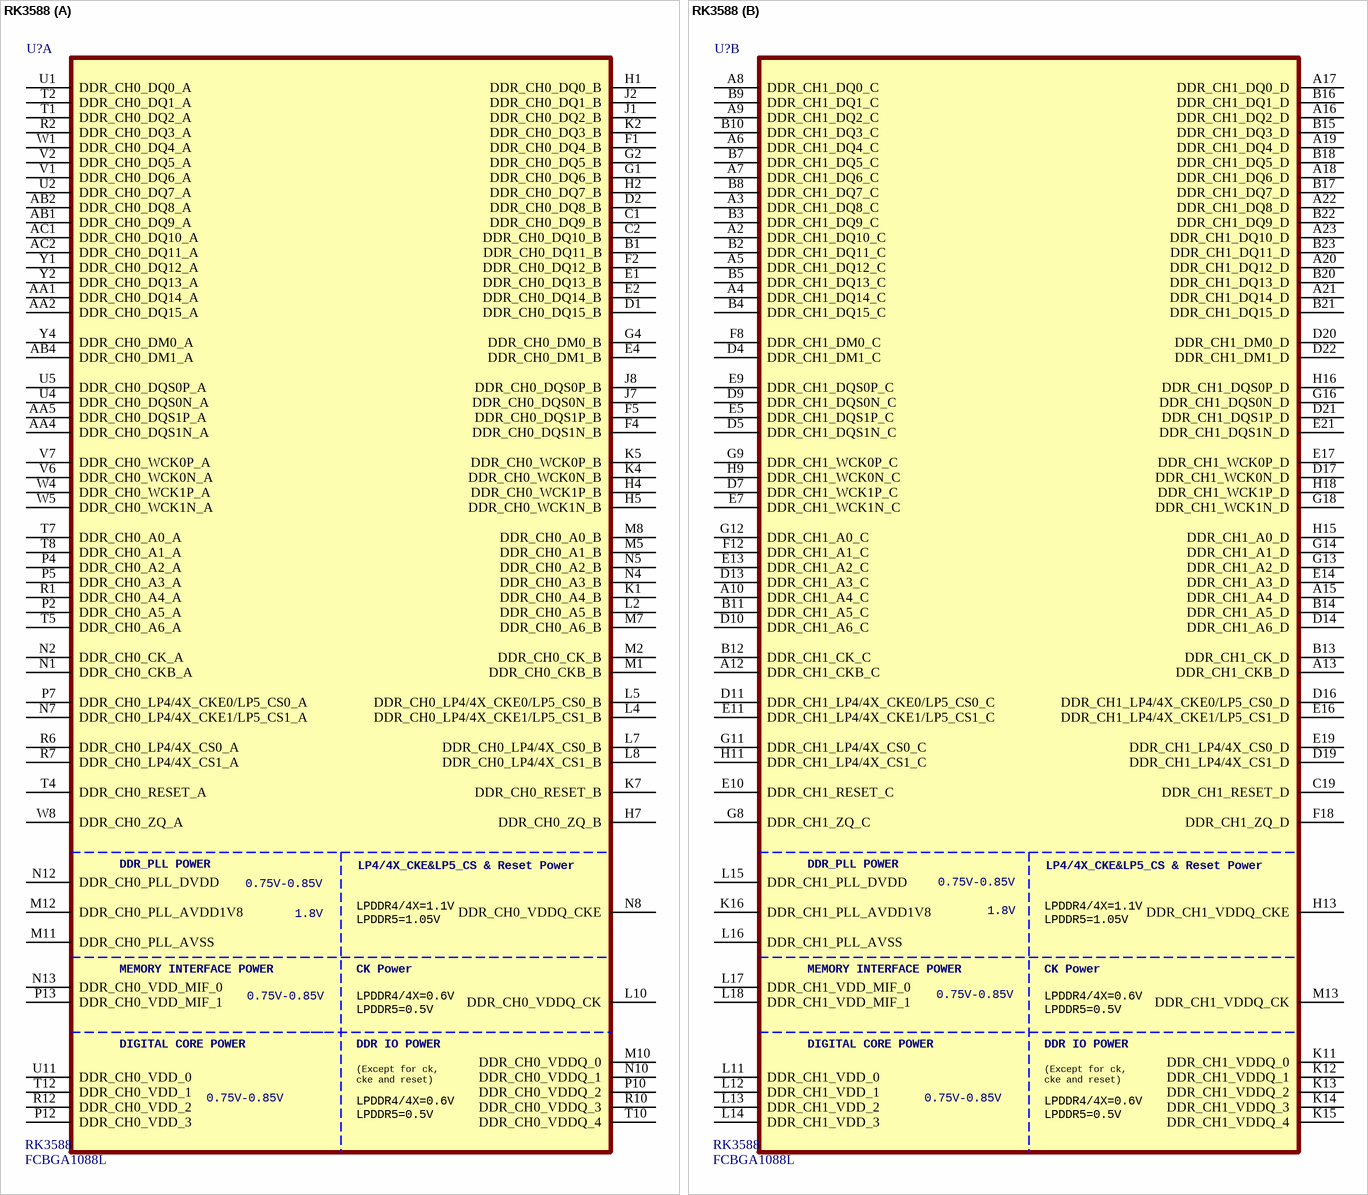
[diagram p22: symbol RK3588]

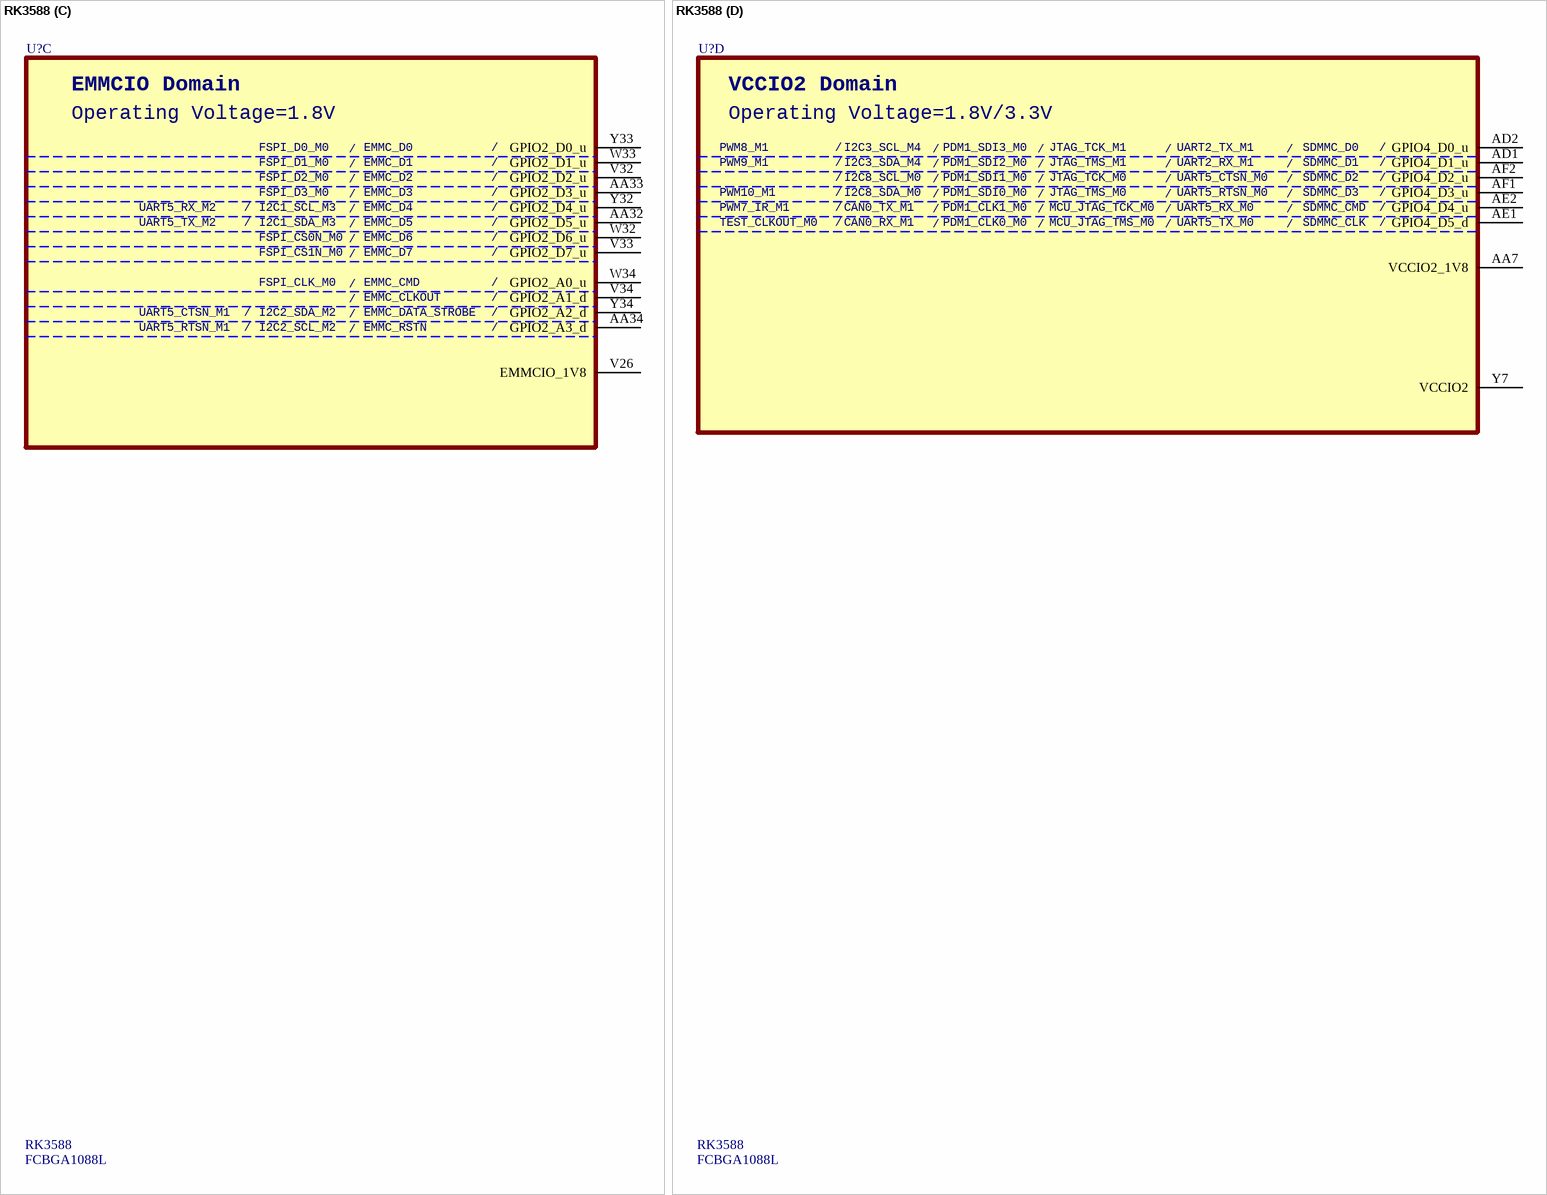
[diagram p23: symbol RK3588]

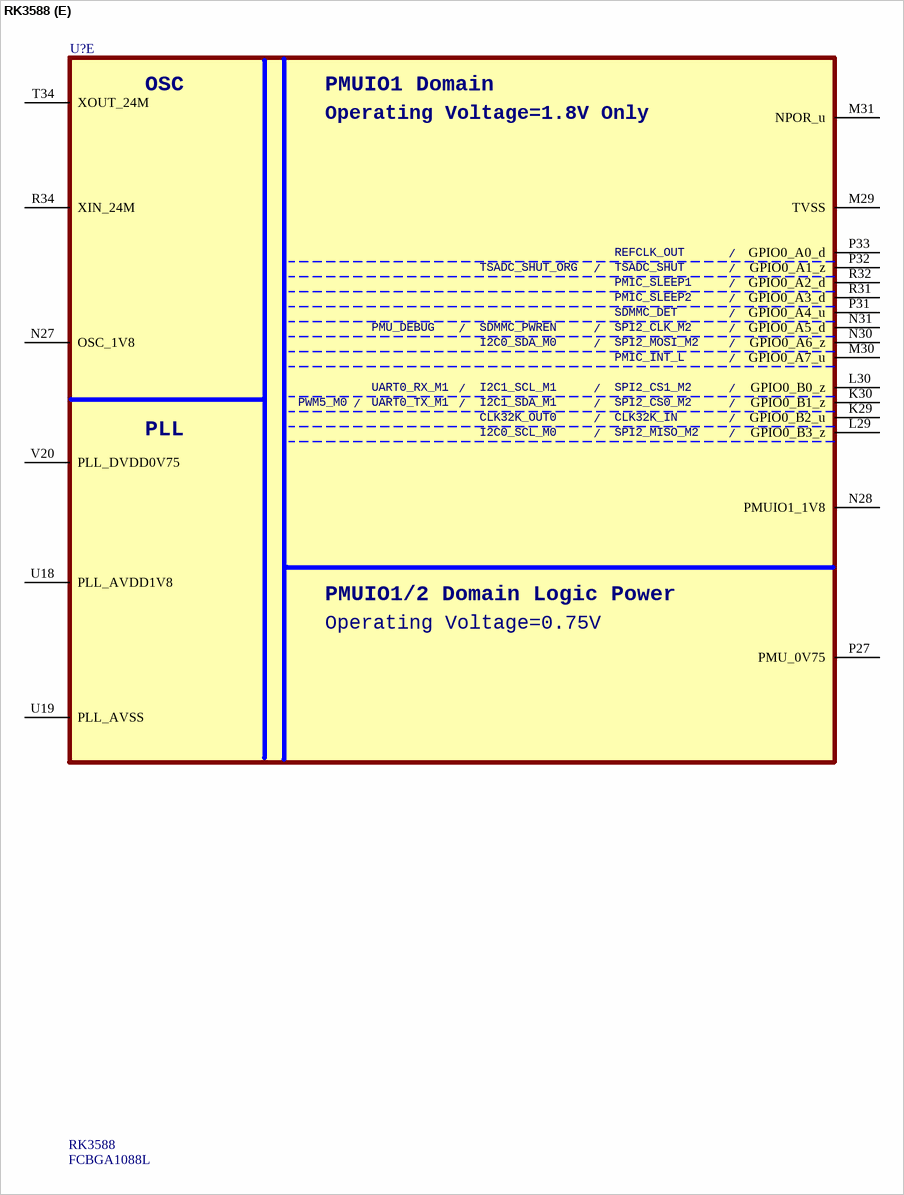
[diagram p24: symbol RK3588]
